# Altium footprint library Transformers.PcbLib: 81 footprints (part 4 of 6)
Each footprint in its own frame and in the unit in brackets; x right, y up, seen from the top. Pads: shape width x height; smd on the part's side, far side on the other; paste and mask are expansions set on the pad; w line width, h text height; cw(c..) or ccw(c..) is an arc to the next point about the centre after c.
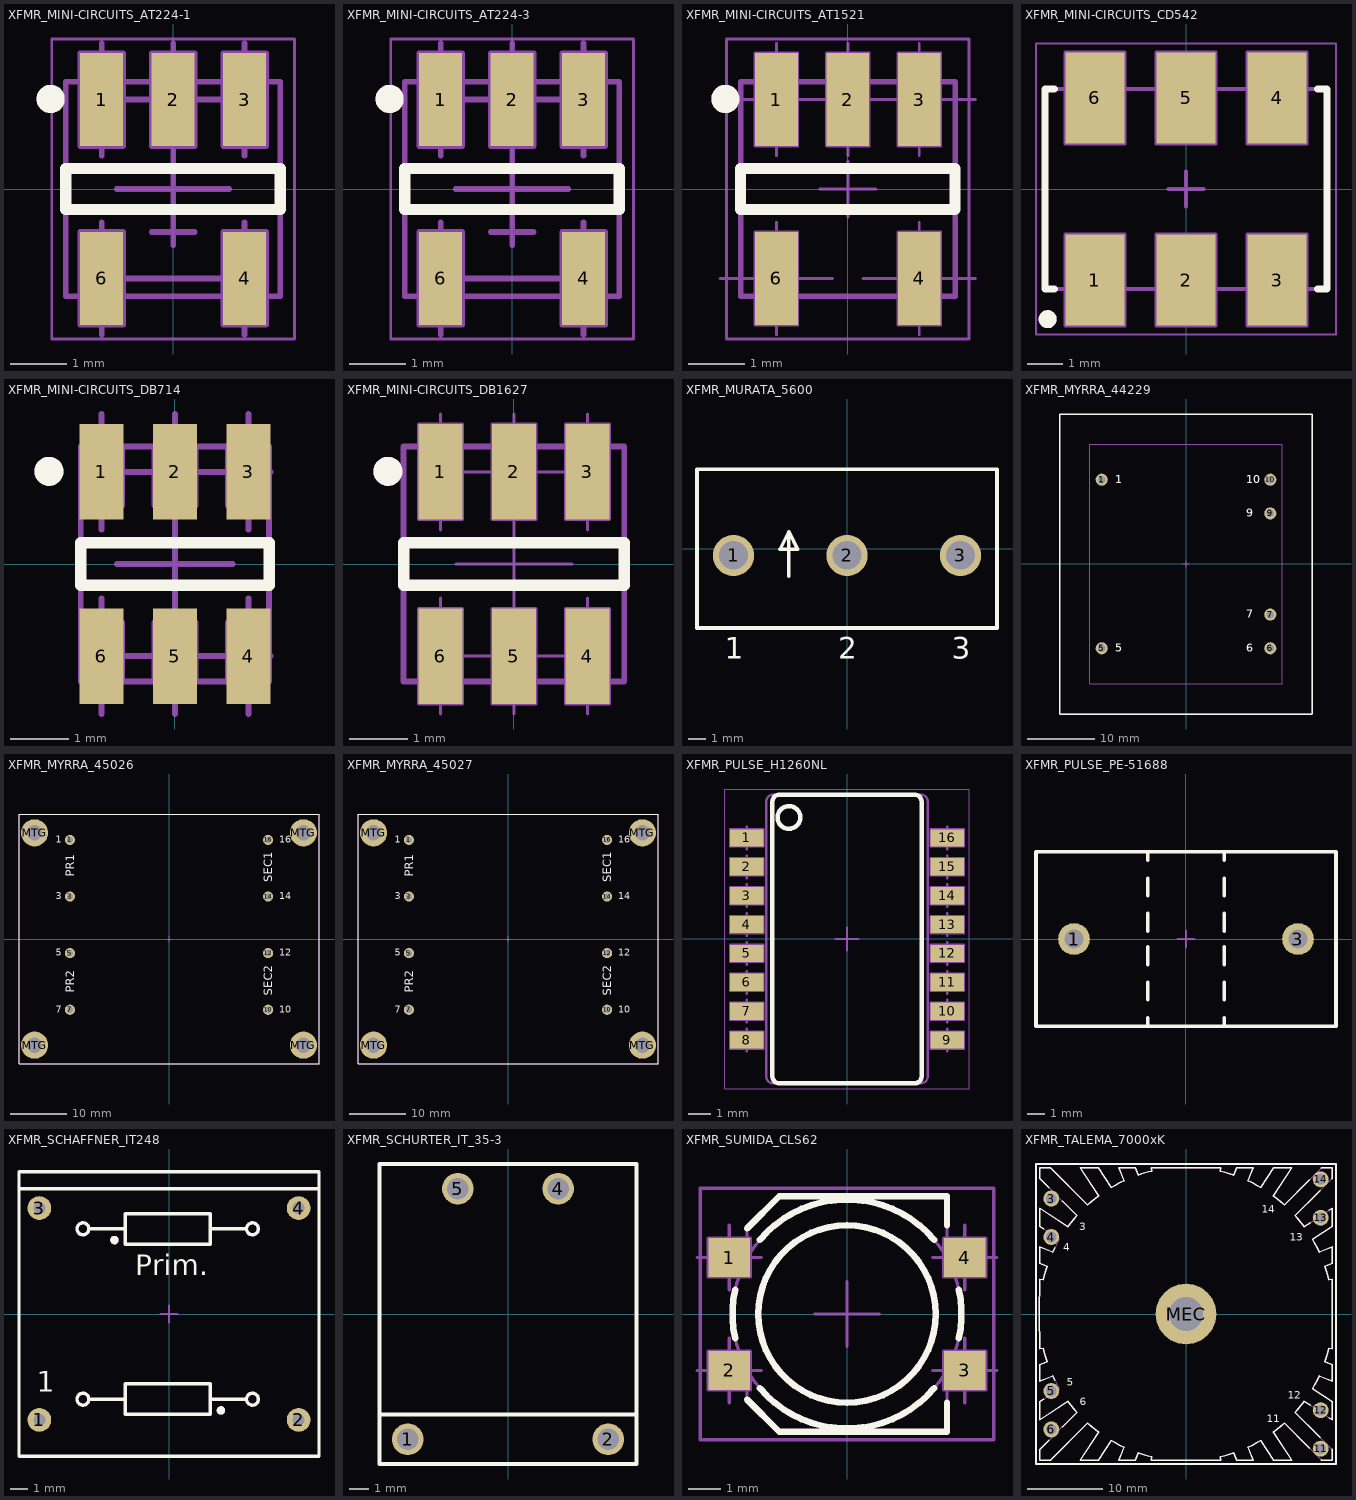
[diagram p3: the footprints below, top view; thin cyan lines are the x and y axes]

## XFMR_MINI-CIRCUITS_AT224-1 [mm] "MINI-CIRCUITS RF Transformer, Case AT224-1 - Body 3.81X3.81mm"
height 4.06
pads (5):
  rect 0.76x1.65 smd: 1(-1.27,1.59) 2(0,1.59) 3(1.27,1.59) 4(1.27,-1.59) 6(-1.27,-1.59)
Top Overlay:
  circle w0.25: c-2.175,1.6 r0.125
  lines w0.2: -1.905,-0.365 1.905,-0.365 1.905,0.365 -1.905,0.365 -1.905,-0.365
Mechanical 8:
  lines w0.1: -1.27,-2.59 -1.27,-1.59 ; -1.27,-0.59 -1.27,-1.59 ; -1.27,0.59 -1.27,1.59 ; -1.27,2.59 -1.27,1.59 ; -1,0 0,0 ; -0.38,-0.765 0.38,-0.765 ; 0,-1 0,0 ; 0,0.59 0,1.59 0,2.59 ; 0,1 0,0 ; 1,0 0,0 ; 1.27,-2.59 1.27,-1.59 1.27,-0.59 ; 1.27,0.59 1.27,1.59 1.27,2.59 ; 1.65,-1.59 -1.27,-1.59 ; 1.65,1.59 -1.27,1.59 ; -1.65,-2.415 -0.89,-2.415 -0.89,-0.765 -1.65,-0.765 -1.65,-2.415 ; -1.65,0.765 -0.89,0.765 -0.89,2.415 -1.65,2.415 -1.65,0.765 ; -0.38,0.765 0.38,0.765 0.38,2.415 -0.38,2.415 -0.38,0.765 ; 0.89,-2.415 1.65,-2.415 1.65,-0.765 0.89,-0.765 0.89,-2.415 ; 0.89,0.765 1.65,0.765 1.65,2.415 0.89,2.415 0.89,0.765
Mechanical 14:
  circle w0.25: c-2.175,1.6 r0.125
  lines w0.1: -1.625,-1.905 -1.625,-1.145 -0.915,-1.145 -0.915,-1.905 ; -1.625,1.905 -1.625,1.145 -0.915,1.145 -0.915,1.905 ; -0.355,1.905 -0.355,1.145 0.355,1.145 0.355,1.905 ; 0.915,-1.905 0.915,-1.145 1.625,-1.145 1.625,-1.905 ; 0.915,1.905 0.915,1.145 1.625,1.145 1.625,1.905 ; -1.905,-1.905 1.905,-1.905 1.905,1.905 -1.905,1.905 -1.905,-1.905
Mechanical 15:
  lines w0.05: -2.155,-2.665 2.155,-2.665 2.155,2.665 -2.155,2.665 -2.155,-2.665
3D body "XFMR_MINI-CIRCUITS_AT224-1.stp": height 4.06, standoff 0, extent -1.905,-1.905 1.905,1.905

## XFMR_MINI-CIRCUITS_AT224-3 [mm] "MINI-CIRCUITS RF Transformer, Case AT224-3 - Body 3.81X3.81mm"
height 3.81
pads (5):
  rect 0.76x1.65 smd: 1(-1.27,1.59) 2(0,1.59) 3(1.27,1.59) 4(1.27,-1.59) 6(-1.27,-1.59)
Top Overlay:
  circle w0.25: c-2.175,1.6 r0.125
  lines w0.2: -1.905,-0.365 -1.905,0.365 1.905,0.365 1.905,-0.365 -1.905,-0.365
Mechanical 8:
  lines w0.1: -1.27,-2.59 -1.27,-1.59 ; -1.27,-0.59 -1.27,-1.59 ; -1.27,0.59 -1.27,1.59 ; -1.27,2.59 -1.27,1.59 ; -1,0 0,0 ; -0.38,-0.765 0.38,-0.765 ; 0,-1 0,0 ; 0,0.59 0,1.59 0,2.59 ; 0,1 0,0 ; 1,0 0,0 ; 1.27,-2.59 1.27,-1.59 1.27,-0.59 ; 1.27,0.59 1.27,1.59 1.27,2.59 ; 1.65,-1.59 -1.27,-1.59 ; 1.65,1.59 -1.27,1.59 ; -1.65,-2.415 -1.65,-0.765 -0.89,-0.765 -0.89,-2.415 -1.65,-2.415 ; -1.65,0.765 -1.65,2.415 -0.89,2.415 -0.89,0.765 -1.65,0.765 ; -0.38,0.765 -0.38,2.415 0.38,2.415 0.38,0.765 -0.38,0.765 ; 0.89,-2.415 0.89,-0.765 1.65,-0.765 1.65,-2.415 0.89,-2.415 ; 0.89,0.765 0.89,2.415 1.65,2.415 1.65,0.765 0.89,0.765
Mechanical 14:
  circle w0.25: c-2.175,1.6 r0.125
  lines w0.1: -1.625,-1.905 -1.625,-1.145 -0.915,-1.145 -0.915,-1.905 ; -1.625,1.905 -1.625,1.145 -0.915,1.145 -0.915,1.905 ; -0.355,1.905 -0.355,1.145 0.355,1.145 0.355,1.905 ; 0.915,-1.905 0.915,-1.145 1.625,-1.145 1.625,-1.905 ; 0.915,1.905 0.915,1.145 1.625,1.145 1.625,1.905 ; -1.905,-1.905 -1.905,1.905 1.905,1.905 1.905,-1.905 -1.905,-1.905
Mechanical 15:
  lines w0.05: -2.155,-2.665 -2.155,2.665 2.155,2.665 2.155,-2.665 -2.155,-2.665
3D body "XFMR_MINI-CIRCUITS_AT224-3.stp": height 3.81, standoff 0, extent -1.905,-1.905 1.905,1.905

## XFMR_MINI-CIRCUITS_AT1521 [mm] "MINI-CIRCUITS RF Transformer, Case AT1521, Body 3.81X3.81mm"
height 4.06
pads (5):
  rect 0.76x1.65 smd: 1(-1.27,1.59) 2(0,1.59) 3(1.27,1.59) 4(1.27,-1.59) 6(-1.27,-1.59)
Top Overlay:
  circle w0.25: c-2.175,1.6 r0.125
  lines w0.2: -1.905,-0.365 -1.905,0.365 1.905,0.365 1.905,-0.365 -1.905,-0.365
Mechanical 8:
  lines w0.05: -2.27,-1.59 -0.27,-1.59 ; -2.27,1.59 -0.27,1.59 ; -1.27,-2.59 -1.27,-0.59 ; -1.27,0.59 -1.27,2.59 ; -1,1.59 1,1.59 ; -0.5,0 0,0 ; 0,-0.5 0,0 ; 0,0.5 0,0 ; 0,0.59 0,2.59 ; 0.27,-1.59 2.27,-1.59 ; 0.27,1.59 2.27,1.59 ; 0.5,0 0,0 ; 1.27,-2.59 1.27,-0.59 ; 1.27,0.59 1.27,2.59 ; -1.65,-2.415 -0.89,-2.415 -0.89,-0.765 -1.65,-0.765 -1.65,-2.415 ; -1.65,0.765 -0.89,0.765 -0.89,2.415 -1.65,2.415 -1.65,0.765 ; -0.38,0.765 0.38,0.765 0.38,2.415 -0.38,2.415 -0.38,0.765 ; 0.89,-2.415 1.65,-2.415 1.65,-0.765 0.89,-0.765 0.89,-2.415 ; 0.89,0.765 1.65,0.765 1.65,2.415 0.89,2.415 0.89,0.765
Mechanical 14:
  circle w0.25: c-2.175,1.6 r0.125
  lines w0.1: -1.625,-1.905 -1.625,-0.885 -0.915,-0.885 -0.915,-1.905 ; -1.625,1.905 -1.625,0.885 -0.915,0.885 -0.915,1.905 ; -0.355,1.905 -0.355,0.885 0.355,0.885 0.355,1.905 ; 0.915,-1.905 0.915,-0.885 1.625,-0.885 1.625,-1.905 ; 0.915,1.905 0.915,0.885 1.625,0.885 1.625,1.905 ; -1.905,-1.905 -1.905,1.905 1.905,1.905 1.905,-1.905 -1.905,-1.905
Mechanical 15:
  lines w0.05: -2.155,-2.665 -2.155,2.665 2.155,2.665 2.155,-2.665 -2.155,-2.665
3D body "XFMR_MINI-CIRCUITS_AT1521.stp": height 4.06, standoff 0, extent -1.905,-1.905 1.905,1.905

## XFMR_MINI-CIRCUITS_CD542 [mm] "MINI-CIRCUITS RF Transformer, Case CD542 - Body 7.87 X 5.58mm"
height 2.84
pads (6):
  rect 1.65x2.54 smd: 1(-2.54,-2.54) 2(0,-2.54) 3(2.54,-2.54) 4(2.54,2.54) 5(0,2.54) 6(-2.54,2.54)
Top Overlay:
  circle w0.25: c-3.861,-3.632 r0.125
  lines w0.2: -3.665,-2.79 -3.935,-2.79 -3.935,2.79 -3.665,2.79 ; 3.665,-2.79 3.935,-2.79 3.935,2.79 3.665,2.79
Mechanical 8:
  lines w0.1: -3.04,-2.54 -2.54,-2.54 ; -3.04,2.54 -2.54,2.54 ; -3.04,3.18 -2.54,3.18 ; -2.54,-3.04 -2.54,-2.54 ; -2.54,-2.04 -2.54,-2.54 ; -2.54,2.04 -2.54,2.54 ; -2.54,2.68 -2.54,3.18 ; -2.54,3.04 -2.54,2.54 ; -2.54,3.68 -2.54,3.18 ; -2.04,-2.54 -2.54,-2.54 ; -2.04,2.54 -2.54,2.54 ; -2.04,3.18 -2.54,3.18 ; -0.5,-2.54 0,-2.54 ; -0.5,0 0,0 ; -0.5,2.54 0,2.54 ; 0,-3.04 0,-2.54 ; 0,-2.04 0,-2.54 ; 0,-0.5 0,0 ; 0,0.5 0,0 ; 0,2.04 0,2.54 ; 0,3.04 0,2.54 ; 0.5,-2.54 0,-2.54 ; 0.5,0 0,0 ; 0.5,2.54 0,2.54 ; 2.04,-2.54 2.54,-2.54 ; 2.04,2.54 2.54,2.54 ; 2.54,-3.04 2.54,-2.54 ; 2.54,-2.04 2.54,-2.54 ; 2.54,2.04 2.54,2.54 ; 2.54,3.04 2.54,2.54 ; 3.04,-2.54 2.54,-2.54 ; 3.04,2.54 2.54,2.54 ; -3.365,-3.81 -3.365,-1.27 -1.715,-1.27 -1.715,-3.81 -3.365,-3.81 ; -3.365,1.27 -1.715,1.27 -1.715,3.81 -3.365,3.81 -3.365,1.27 ; -0.825,-3.81 0.825,-3.81 0.825,-1.27 -0.825,-1.27 -0.825,-3.81 ; -0.825,1.27 0.825,1.27 0.825,3.81 -0.825,3.81 -0.825,1.27 ; 1.715,-3.81 3.365,-3.81 3.365,-1.27 1.715,-1.27 1.715,-3.81 ; 1.715,1.27 3.365,1.27 3.365,3.81 1.715,3.81 1.715,1.27
Mechanical 14:
  circle w0.25: c-3.861,-3.632 r0.125
  lines w0.1: -2.92,-2.79 -2.92,-3.45 -2.16,-3.45 -2.16,-2.79 ; -2.92,2.79 -2.92,3.45 -2.16,3.45 -2.16,2.79 ; -0.38,-2.79 -0.38,-3.45 0.38,-3.45 0.38,-2.79 ; -0.38,2.79 -0.38,3.45 0.38,3.45 0.38,2.79 ; 2.16,-2.79 2.16,-3.45 2.92,-3.45 2.92,-2.79 ; 2.16,2.79 2.16,3.45 2.92,3.45 2.92,2.79 ; -3.935,-2.79 -3.935,2.79 3.935,2.79 3.935,-2.79 -3.935,-2.79
Mechanical 15:
  lines w0.05: -4.185,-4.06 -4.185,4.06 4.185,4.06 4.185,-4.06 -4.185,-4.06
3D body "XFMR_MINI-CIRCUITS_CD542.stp": height 2.84, standoff 0, extent -3.935,-3.45 3.935,3.45

## XFMR_MINI-CIRCUITS_DB714 [mm] "MINI-CIRCUITS RF Transformer, Case DB715 - Body 4.06X3.81mm"
height 4.06
pads (6):
  rect 0.76x1.65 smd: 1(-1.27,1.59) 2(0,1.59) 3(1.27,1.59) 4(1.27,-1.59) 5(0,-1.59) 6(-1.27,-1.59)
Top Overlay:
  circle w0.25: c-2.175,1.6 r0.125
  lines w0.2: -1.625,-0.365 1.625,-0.365 1.625,0.365 -1.625,0.365 -1.625,-0.365
Mechanical 8:
  lines w0.1: -1.27,-2.59 -1.27,-1.59 ; -1.27,-0.59 -1.27,-1.59 ; -1.27,0.59 -1.27,1.59 ; -1.27,2.59 -1.27,1.59 ; -1,0 0,0 ; 0,-2.59 0,-1.59 0,-0.59 ; 0,-1 0,0 ; 0,0.59 0,1.59 0,2.59 ; 0,1 0,0 ; 1,0 0,0 ; 1.27,-2.59 1.27,-1.59 1.27,-0.59 ; 1.27,0.59 1.27,1.59 1.27,2.59 ; 1.65,-1.59 -1.27,-1.59 ; 1.65,1.59 -1.27,1.59
Mechanical 14:
  circle w0.25: c-2.175,1.6 r0.125
  lines w0.1: -1.625,-2.03 1.625,-2.03 ; -1.625,-2.03 -1.625,2.03 ; -1.625,-2.03 -1.625,-1.01 -0.915,-1.01 -0.915,-2.03 -1.625,-2.03 ; -1.625,2.03 1.625,2.03 ; -1.625,2.03 -1.625,1.01 -0.915,1.01 -0.915,2.03 -1.625,2.03 ; 1.625,-2.03 1.625,2.03 ; 1.625,-2.03 0.915,-2.03 0.915,-1.01 1.625,-1.01 1.625,-2.03 ; 1.625,2.03 1.625,1.01 0.915,1.01 0.915,2.03 1.625,2.03 ; -0.355,-2.03 -0.355,-1.01 0.355,-1.01 0.355,-2.03 -0.355,-2.03 ; -0.355,1.01 -0.355,2.03 0.355,2.03 0.355,1.01 -0.355,1.01
3D body "XFMR_MINI-CIRCUITS_DB714.stp": height 3.76, standoff 0, extent -1.625,-2.03 1.625,2.03

## XFMR_MINI-CIRCUITS_DB1627 [mm] "MINI-CIRCUITS RF Transformer, Case DB1627 - Body 4.06X3.81mm"
height 4.06
pads (6):
  rect 0.76x1.65 smd: 1(-1.27,1.59) 2(0,1.59) 3(1.27,1.59) 4(1.27,-1.59) 5(0,-1.59) 6(-1.27,-1.59)
Top Overlay:
  circle w0.25: c-2.175,1.6 r0.125
  lines w0.2: -1.905,-0.365 -1.905,0.365 1.905,0.365 1.905,-0.365 -1.905,-0.365
Mechanical 8:
  lines w0.05: -1.27,-2.59 -1.27,-1.59 ; -1.27,-0.59 -1.27,-1.59 ; -1.27,0.59 -1.27,1.59 ; -1.27,2.59 -1.27,1.59 ; -1,0 0,0 ; 0,-2.59 0,-1.59 0,-0.59 ; 0,-1 0,0 ; 0,0.59 0,1.59 0,2.59 ; 0,1 0,0 ; 1,0 0,0 ; 1.27,-2.59 1.27,-1.59 1.27,-0.59 ; 1.27,0.59 1.27,1.59 1.27,2.59 ; 1.65,-1.59 -1.27,-1.59 ; 1.65,1.59 -1.27,1.59 ; -1.65,-2.415 -1.65,-0.765 -0.89,-0.765 -0.89,-2.415 -1.65,-2.415 ; -1.65,0.765 -1.65,2.415 -0.89,2.415 -0.89,0.765 -1.65,0.765 ; -0.38,-2.415 -0.38,-0.765 0.38,-0.765 0.38,-2.415 -0.38,-2.415 ; -0.38,0.765 -0.38,2.415 0.38,2.415 0.38,0.765 -0.38,0.765 ; 0.89,-2.415 0.89,-0.765 1.65,-0.765 1.65,-2.415 0.89,-2.415 ; 0.89,0.765 0.89,2.415 1.65,2.415 1.65,0.765 0.89,0.765
Mechanical 14:
  circle w0.25: c-2.175,1.6 r0.125
  lines w0.1: -1.905,-2.03 -1.905,2.03 1.905,2.03 1.905,-2.03 -1.905,-2.03 ; -1.625,-2.03 -0.915,-2.03 -0.915,-1.01 -1.625,-1.01 -1.625,-2.03 ; -1.625,1.01 -0.915,1.01 -0.915,2.03 -1.625,2.03 -1.625,1.01 ; -0.355,-2.03 0.355,-2.03 0.355,-1.01 -0.355,-1.01 -0.355,-2.03 ; -0.355,1.01 0.355,1.01 0.355,2.03 -0.355,2.03 -0.355,1.01 ; 0.915,-2.03 1.625,-2.03 1.625,-1.01 0.915,-1.01 0.915,-2.03 ; 0.915,1.01 1.625,1.01 1.625,2.03 0.915,2.03 0.915,1.01
3D body "XFMR_MINI-CIRCUITS_DB1627.stp": height 4.06, standoff 0, extent -1.905,-2.03 1.905,2.03

## XFMR_MURATA_5600 [mm] "MURATA Current Sensing Transformer, Body 16.79x8.89mm, 5600 Serie"
height 20.44
pads (3):
  round 2.3 hole 1.6: 1(-6.35,-0.386) 2(0,-0.386) 3(6.35,-0.386)
Top Overlay:
  lines w0.2: -3.25,-1.55 -3.25,0.95 ; -3.25,0.95 -2.75,-0.05 -3.75,-0.05 -3.25,0.95 ; -8.395,-4.445 8.395,-4.445 8.395,4.445 -8.395,4.445 -8.395,-4.445
  text "3" at 5.86,-6.175 h1.2
  text "2" at -0.49,-6.175 h1.2
  text "1" at -6.84,-6.175 h1.2
Mechanical 8:
  lines w0.1: -6.85,-0.386 -6.35,-0.386 ; -6.35,-0.886 -6.35,-0.386 ; -6.35,0.114 -6.35,-0.386 ; -5.85,-0.386 -6.35,-0.386 ; -0.5,-0.386 0,-0.386 ; -0.5,0 0,0 ; 0,-0.886 0,-0.386 ; 0,0.5 0,0 ; 0.5,-0.386 0,-0.386 ; 0.5,0 0,0 ; 5.85,-0.386 6.35,-0.386 ; 6.35,-0.886 6.35,-0.386 ; 6.35,0.114 6.35,-0.386 ; 6.85,-0.386 6.35,-0.386
Mechanical 14:
  lines w0.1: -3.25,-1.55 -3.25,0.95 ; -3.25,0.95 -3.75,-0.05 -2.75,-0.05 -3.25,0.95 ; -8.395,-4.445 8.395,-4.445 8.395,4.445 -8.395,4.445 -8.395,-4.445
  text "3" at 5.86,-6.175 h1.2
  text "2" at -0.49,-6.175 h1.2
  text "1" at -6.84,-6.175 h1.2
3D body "XFMR_MURATA_56000.stp": height 20.19, standoff -3.6, extent -8.395,-4.445 8.395,4.445

## XFMR_MYRRA_44229 [mm] "250V to 6V EI 42x14.8, 5VA Encapsulated Transformer Serie  44000"
height 32.8
pads (6):
  round 1.8 hole 1.1: 1(-12.5,12.5) 5(-12.5,-12.5) 6(12.5,-12.5) 7(12.5,-7.5) 9(12.5,7.5) 10(12.5,12.5)
Top Overlay:
  lines w0.2: -18.75,-22.25 -18.75,22.25 18.75,22.25 18.75,-22.25 -18.75,-22.25
  text "1" at -10.475,12 h1.2
  text "5" at -10.475,-13 h1.2
  text "10" at 8.95,12 h1.2
  text "9" at 8.95,7 h1.2
  text "7" at 8.95,-8 h1.2
  text "6" at 8.95,-13 h1.2
  text "6" at 8.95,-13 h1.2
  text "7" at 8.95,-8 h1.2
  text "9" at 8.95,7 h1.2
  text "10" at 8.95,12 h1.2
  text "5" at -10.475,-13 h1.2
  text "1" at -10.475,12 h1.2
Mechanical 8:
  lines w0.1: -13,-12.5 -12.5,-12.5 ; -13,12.5 -12.5,12.5 ; -12.5,-13 -12.5,-12.5 ; -12.5,-12 -12.5,-12.5 ; -12.5,12 -12.5,12.5 ; -12.5,13 -12.5,12.5 ; -12,-12.5 -12.5,-12.5 ; -12,12.5 -12.5,12.5 ; -0.5,0 0,0 ; 0,-0.5 0,0 ; 0,0.5 0,0 ; 0.5,0 0,0 ; 12,-12.5 12.5,-12.5 ; 12,-7.5 12.5,-7.5 ; 12,7.5 12.5,7.5 ; 12,12.5 12.5,12.5 ; 12.5,-13 12.5,-12.5 ; 12.5,-12 12.5,-12.5 ; 12.5,-8 12.5,-7.5 ; 12.5,-7 12.5,-7.5 ; 12.5,7 12.5,7.5 ; 12.5,8 12.5,7.5 ; 12.5,12 12.5,12.5 ; 12.5,13 12.5,12.5 ; 13,-12.5 12.5,-12.5 ; 13,-7.5 12.5,-7.5 ; 13,7.5 12.5,7.5 ; 13,12.5 12.5,12.5
Mechanical 14:
  lines w0.1: -18.75,-22.25 -18.75,22.25 18.75,22.25 18.75,-22.25 -18.75,-22.25 ; -14.25,-17.75 14.25,-17.75 14.25,17.75 -14.25,17.75 -14.25,-17.75
3D body "XFMR_MYRRA_44229.stp": height 32.8, standoff -3.6, extent -18.75,-22.25 18.75,22.25

## XFMR_MYRRA_45026 [mm] "250V to 2x9V, UI 30, 6VA Encapsulated Transformer Serie  45000"
height 22
pads (12):
  round 1.8 hole 1.1: 1(-17.5,17.5) 3(-17.5,7.5) 5(-17.5,-2.5) 7(-17.5,-12.5) 10(17.5,-12.5) 12(17.5,-2.5) 14(17.5,7.5) 16(17.5,17.5)
  round 4.8 hole 2.7: MTG(-23.75,-18.75) MTG(-23.75,18.75) MTG(23.75,-18.75) MTG(23.75,18.75)
Top Overlay:
  lines w0.2: -26.5,-22 26.5,-22 26.5,22 -26.5,22 -26.5,-22
  text "SEC1" at 18.25,10 h1.5
  text "SEC2" at 18.25,-10 h1.5
  text "PR2" at -16.75,-9.5 h1.5
  text "PR1" at -16.75,11 h1.5
  text "1" at -20,17 h1.2
  text "3" at -20,7 h1.2
  text "5" at -20,-3 h1.2
  text "7" at -20,-13 h1.2
  text "16" at 19.5,17 h1.2
  text "14" at 19.5,7 h1.2
  text "12" at 19.5,-3 h1.2
  text "10" at 19.5,-13 h1.2
Mechanical 8:
  lines w0.1: -24.25,-18.75 -23.75,-18.75 ; -24.25,18.75 -23.75,18.75 ; -23.75,-19.25 -23.75,-18.75 ; -23.75,-18.25 -23.75,-18.75 ; -23.75,18.25 -23.75,18.75 ; -23.75,19.25 -23.75,18.75 ; -23.25,-18.75 -23.75,-18.75 ; -23.25,18.75 -23.75,18.75 ; -18,-12.5 -17.5,-12.5 ; -18,-2.5 -17.5,-2.5 ; -18,7.5 -17.5,7.5 ; -18,17.5 -17.5,17.5 ; -17.5,-13 -17.5,-12.5 ; -17.5,-12 -17.5,-12.5 ; -17.5,-3 -17.5,-2.5 ; -17.5,-2 -17.5,-2.5 ; -17.5,7 -17.5,7.5 ; -17.5,8 -17.5,7.5 ; -17.5,17 -17.5,17.5 ; -17.5,18 -17.5,17.5 ; -17,-12.5 -17.5,-12.5 ; -17,-2.5 -17.5,-2.5 ; -17,7.5 -17.5,7.5 ; -17,17.5 -17.5,17.5 ; -0.5,0 0,0 ; 0,-0.5 0,0 ; 0,0.5 0,0 ; 0.5,0 0,0 ; 17,-12.5 17.5,-12.5 ; 17,-2.5 17.5,-2.5 ; 17,7.5 17.5,7.5 ; 17,17.5 17.5,17.5 ; 17.5,-13 17.5,-12.5 ; 17.5,-12 17.5,-12.5 ; 17.5,-3 17.5,-2.5 ; 17.5,-2 17.5,-2.5 ; 17.5,7 17.5,7.5 ; 17.5,8 17.5,7.5 ; 17.5,17 17.5,17.5 ; 17.5,18 17.5,17.5 ; 18,-12.5 17.5,-12.5 ; 18,-2.5 17.5,-2.5 ; 18,7.5 17.5,7.5 ; 18,17.5 17.5,17.5 ; 23.25,-18.75 23.75,-18.75 ; 23.25,18.75 23.75,18.75 ; 23.75,-19.25 23.75,-18.75 ; 23.75,-18.25 23.75,-18.75 ; 23.75,18.25 23.75,18.75 ; 23.75,19.25 23.75,18.75 ; 24.25,-18.75 23.75,-18.75 ; 24.25,18.75 23.75,18.75
Mechanical 14:
  lines w0.1: -26.5,-22 26.5,-22 26.5,22 -26.5,22 -26.5,-22
3D body "XFMR_MYRRA_45026.stp": height 22, standoff -4, extent -26.5,-22 26.5,22

## XFMR_MYRRA_45027 [mm] "250V to 2x12V, UI 30, 6VA Encapsulated Transformer Serie  45000"
height 22
pads (12):
  round 1.8 hole 1.1: 1(-17.5,17.5) 3(-17.5,7.5) 5(-17.5,-2.5) 7(-17.5,-12.5) 10(17.5,-12.5) 12(17.5,-2.5) 14(17.5,7.5) 16(17.5,17.5)
  round 4.8 hole 2.7: MTG(-23.75,-18.75) MTG(-23.75,18.75) MTG(23.75,-18.75) MTG(23.75,18.75)
Top Overlay:
  lines w0.2: -26.5,-22 26.5,-22 26.5,22 -26.5,22 -26.5,-22
  text "SEC1" at 18.25,10 h1.5
  text "SEC2" at 18.25,-10 h1.5
  text "PR2" at -16.75,-9.5 h1.5
  text "PR1" at -16.75,11 h1.5
  text "1" at -20,17 h1.2
  text "3" at -20,7 h1.2
  text "5" at -20,-3 h1.2
  text "7" at -20,-13 h1.2
  text "16" at 19.5,17 h1.2
  text "14" at 19.5,7 h1.2
  text "12" at 19.5,-3 h1.2
  text "10" at 19.5,-13 h1.2
Mechanical 8:
  lines w0.1: -24.25,-18.75 -23.75,-18.75 ; -24.25,18.75 -23.75,18.75 ; -23.75,-19.25 -23.75,-18.75 ; -23.75,-18.25 -23.75,-18.75 ; -23.75,18.25 -23.75,18.75 ; -23.75,19.25 -23.75,18.75 ; -23.25,-18.75 -23.75,-18.75 ; -23.25,18.75 -23.75,18.75 ; -18,-12.5 -17.5,-12.5 ; -18,-2.5 -17.5,-2.5 ; -18,7.5 -17.5,7.5 ; -18,17.5 -17.5,17.5 ; -17.5,-13 -17.5,-12.5 ; -17.5,-12 -17.5,-12.5 ; -17.5,-3 -17.5,-2.5 ; -17.5,-2 -17.5,-2.5 ; -17.5,7 -17.5,7.5 ; -17.5,8 -17.5,7.5 ; -17.5,17 -17.5,17.5 ; -17.5,18 -17.5,17.5 ; -17,-12.5 -17.5,-12.5 ; -17,-2.5 -17.5,-2.5 ; -17,7.5 -17.5,7.5 ; -17,17.5 -17.5,17.5 ; -0.5,0 0,0 ; 0,-0.5 0,0 ; 0,0.5 0,0 ; 0.5,0 0,0 ; 17,-12.5 17.5,-12.5 ; 17,-2.5 17.5,-2.5 ; 17,7.5 17.5,7.5 ; 17,17.5 17.5,17.5 ; 17.5,-13 17.5,-12.5 ; 17.5,-12 17.5,-12.5 ; 17.5,-3 17.5,-2.5 ; 17.5,-2 17.5,-2.5 ; 17.5,7 17.5,7.5 ; 17.5,8 17.5,7.5 ; 17.5,17 17.5,17.5 ; 17.5,18 17.5,17.5 ; 18,-12.5 17.5,-12.5 ; 18,-2.5 17.5,-2.5 ; 18,7.5 17.5,7.5 ; 18,17.5 17.5,17.5 ; 23.25,-18.75 23.75,-18.75 ; 23.25,18.75 23.75,18.75 ; 23.75,-19.25 23.75,-18.75 ; 23.75,-18.25 23.75,-18.75 ; 23.75,18.25 23.75,18.75 ; 23.75,19.25 23.75,18.75 ; 24.25,-18.75 23.75,-18.75 ; 24.25,18.75 23.75,18.75
Mechanical 14:
  lines w0.1: -26.5,-22 26.5,-22 26.5,22 -26.5,22 -26.5,-22
3D body "XFMR_MYRRA_45027.stp": height 22, standoff -4, extent -26.5,-22 26.5,22

## XFMR_PULSE_H1260NL [mm] "10/100BASE-T Transformer Modules, Body 7.11 x 12.7mm"
height 6
pads (16):
  rect 1.46x0.76 smd: 1(-4.41,4.445) 2(-4.41,3.175) 3(-4.41,1.905) 4(-4.41,0.635) 5(-4.41,-0.635) 6(-4.41,-1.905) 7(-4.41,-3.175) 8(-4.41,-4.445) 9(4.41,-4.445) 10(4.41,-3.175) 11(4.41,-1.905) 12(4.41,-0.635) 13(4.41,0.635) 14(4.41,1.905) 15(4.41,3.175) 16(4.41,4.445)
Top Overlay:
  circle w0.2: c-2.555,5.35 r0.5
  lines w0.2: -3.28,-6.05 ccw(c-2.98,-6.05) -2.98,-6.35 2.98,-6.35 ccw(c2.98,-6.05) 3.28,-6.05 3.28,6.05 ccw(c2.98,6.05) 2.98,6.35 -2.98,6.35 ccw(c-2.98,6.05) -3.28,6.05 -3.28,-6.05
Mechanical 8:
  lines w0.1: -4.91,-4.445 -4.41,-4.445 ; -4.91,-3.175 -4.41,-3.175 ; -4.91,-1.905 -4.41,-1.905 ; -4.91,-0.635 -4.41,-0.635 ; -4.91,0.635 -4.41,0.635 ; -4.91,1.905 -4.41,1.905 ; -4.91,3.175 -4.41,3.175 ; -4.91,4.445 -4.41,4.445 ; -4.41,-4.945 -4.41,-4.445 ; -4.41,-3.945 -4.41,-4.445 ; -4.41,-3.675 -4.41,-3.175 ; -4.41,-2.675 -4.41,-3.175 ; -4.41,-2.405 -4.41,-1.905 ; -4.41,-1.405 -4.41,-1.905 ; -4.41,-1.135 -4.41,-0.635 ; -4.41,-0.135 -4.41,-0.635 ; -4.41,0.135 -4.41,0.635 ; -4.41,1.135 -4.41,0.635 ; -4.41,1.405 -4.41,1.905 ; -4.41,2.405 -4.41,1.905 ; -4.41,2.675 -4.41,3.175 ; -4.41,3.675 -4.41,3.175 ; -4.41,3.945 -4.41,4.445 ; -4.41,4.945 -4.41,4.445 ; -3.91,-4.445 -4.41,-4.445 ; -3.91,-3.175 -4.41,-3.175 ; -3.91,-1.905 -4.41,-1.905 ; -3.91,-0.635 -4.41,-0.635 ; -3.91,0.635 -4.41,0.635 ; -3.91,1.905 -4.41,1.905 ; -3.91,3.175 -4.41,3.175 ; -3.91,4.445 -4.41,4.445 ; -0.5,0 0,0 ; 0,-0.5 0,0 ; 0,0.5 0,0 ; 0.5,0 0,0 ; 3.91,-4.445 4.41,-4.445 ; 3.91,-3.175 4.41,-3.175 ; 3.91,-1.905 4.41,-1.905 ; 3.91,-0.635 4.41,-0.635 ; 3.91,0.635 4.41,0.635 ; 3.91,1.905 4.41,1.905 ; 3.91,3.175 4.41,3.175 ; 3.91,4.445 4.41,4.445 ; 4.41,-4.945 4.41,-4.445 ; 4.41,-3.945 4.41,-4.445 ; 4.41,-3.675 4.41,-3.175 ; 4.41,-2.675 4.41,-3.175 ; 4.41,-2.405 4.41,-1.905 ; 4.41,-1.405 4.41,-1.905 ; 4.41,-1.135 4.41,-0.635 ; 4.41,-0.135 4.41,-0.635 ; 4.41,0.135 4.41,0.635 ; 4.41,1.135 4.41,0.635 ; 4.41,1.405 4.41,1.905 ; 4.41,2.405 4.41,1.905 ; 4.41,2.675 4.41,3.175 ; 4.41,3.675 4.41,3.175 ; 4.41,3.945 4.41,4.445 ; 4.41,4.945 4.41,4.445 ; 4.91,-4.445 4.41,-4.445 ; 4.91,-3.175 4.41,-3.175 ; 4.91,-1.905 4.41,-1.905 ; 4.91,-0.635 4.41,-0.635 ; 4.91,0.635 4.41,0.635 ; 4.91,1.905 4.41,1.905 ; 4.91,3.175 4.41,3.175 ; 4.91,4.445 4.41,4.445 ; -5.14,-4.825 -5.14,-4.065 -3.68,-4.065 -3.68,-4.825 -5.14,-4.825 ; -5.14,-3.555 -5.14,-2.795 -3.68,-2.795 -3.68,-3.555 -5.14,-3.555 ; -5.14,-2.285 -5.14,-1.525 -3.68,-1.525 -3.68,-2.285 -5.14,-2.285 ; -5.14,-1.015 -5.14,-0.255 -3.68,-0.255 -3.68,-1.015 -5.14,-1.015 ; -5.14,0.255 -5.14,1.015 -3.68,1.015 -3.68,0.255 -5.14,0.255 ; -5.14,1.525 -5.14,2.285 -3.68,2.285 -3.68,1.525 -5.14,1.525 ; -5.14,2.795 -5.14,3.555 -3.68,3.555 -3.68,2.795 -5.14,2.795 ; -5.14,4.065 -5.14,4.825 -3.68,4.825 -3.68,4.065 -5.14,4.065 ; 3.68,-4.825 3.68,-4.065 5.14,-4.065 5.14,-4.825 3.68,-4.825 ; 3.68,-3.555 3.68,-2.795 5.14,-2.795 5.14,-3.555 3.68,-3.555 ; 3.68,-2.285 3.68,-1.525 5.14,-1.525 5.14,-2.285 3.68,-2.285 ; 3.68,-1.015 3.68,-0.255 5.14,-0.255 5.14,-1.015 3.68,-1.015 ; 3.68,0.255 3.68,1.015 5.14,1.015 5.14,0.255 3.68,0.255 ; 3.68,1.525 3.68,2.285 5.14,2.285 5.14,1.525 3.68,1.525 ; 3.68,2.795 3.68,3.555 5.14,3.555 5.14,2.795 3.68,2.795 ; 3.68,4.065 3.68,4.825 5.14,4.825 5.14,4.065 3.68,4.065
Mechanical 14:
  circle w0.1: c-2.555,5.35 r0.5
  lines w0.1: -3.555,-6.05 ccw(c-3.255,-6.05) -3.255,-6.35 3.255,-6.35 ccw(c3.255,-6.05) 3.555,-6.05 3.555,6.05 ccw(c3.255,6.05) 3.255,6.35 -3.255,6.35 ccw(c-3.255,6.05) -3.555,6.05 -3.555,-6.05
Mechanical 15:
  lines w0.05: -5.39,-6.6 5.39,-6.6 5.39,6.6 -5.39,6.6 -5.39,-6.6
3D body "XFMR_PULSE_H1260NL.stp": height 6, standoff 0, extent -4.775,-6.35 4.775,6.35

## XFMR_PULSE_PE-51688 [mm] "20kHz To 200kHz 20A Current Sense Transformer, Body 17.01mm x 9.906mm"
height 20.32
pads (2):
  round 1.8 hole 1.1: 1(-6.35,0) 3(6.35,0)
Top Overlay:
  lines w0.2: -2.16,-4.953 -2.16,-4.453 ; -2.16,-3.453 -2.16,-2.453 ; -2.16,-1.453 -2.16,-0.453 ; -2.16,0.453 -2.16,1.453 ; -2.16,2.453 -2.16,3.453 ; -2.16,4.453 -2.16,4.953 ; 2.16,-4.953 2.16,-4.453 ; 2.16,-3.453 2.16,-2.453 ; 2.16,-1.453 2.16,-0.453 ; 2.16,0.453 2.16,1.453 ; 2.16,2.453 2.16,3.453 ; 2.16,4.453 2.16,4.953 ; -8.505,-4.953 8.505,-4.953 8.505,4.953 -8.505,4.953 -8.505,-4.953
Mechanical 8:
  lines w0.1: -6.85,0 -6.35,0 ; -6.35,-0.5 -6.35,0 ; -6.35,0.5 -6.35,0 ; -5.85,0 -6.35,0 ; -0.5,0 0,0 ; 0,-0.5 0,0 ; 0,0.5 0,0 ; 0.5,0 0,0 ; 5.85,0 6.35,0 ; 6.35,-0.5 6.35,0 ; 6.35,0.5 6.35,0 ; 6.85,0 6.35,0
Mechanical 14:
  lines w0.1: -2.16,-4.953 -2.16,-4.453 ; -2.16,-3.453 -2.16,-2.453 ; -2.16,-1.453 -2.16,-0.453 ; -2.16,0.453 -2.16,1.453 ; -2.16,2.453 -2.16,3.453 ; -2.16,4.453 -2.16,4.953 ; 2.16,-4.953 2.16,-4.453 ; 2.16,-3.453 2.16,-2.453 ; 2.16,-1.453 2.16,-0.453 ; 2.16,0.453 2.16,1.453 ; 2.16,2.453 2.16,3.453 ; 2.16,4.453 2.16,4.953 ; -8.505,-4.953 8.505,-4.953 8.505,4.953 -8.505,4.953 -8.505,-4.953
3D body "XFMR_PULSE_PE-51688.stp": height 20.28, standoff -3.22, extent -8.505,-4.953 8.505,4.953

## XFMR_SCHAFFNER_IT248 [mm] "Pulse Transformer, Serie IT, Body 17.6mm x 16.7mm"
height 11.4
pads (4):
  round 1.4 hole 0.7: 1(-7.65,-6.25) 2(7.65,-6.25) 3(-7.65,6.25) 4(7.65,6.25)
Top Overlay:
  circle w0.25: c3.064,-5.689 r0.125
  circle w0.2: c-5.077,-5.025 r0.35
  circle w0.2: c4.923,-5.025 r0.35
  circle w0.25: c-3.218,4.362 r0.125
  circle w0.2: c-5.077,5.025 r0.35
  circle w0.2: c4.923,5.025 r0.35
  lines w0.2: -8.85,7.4 8.85,7.4 ; -4.727,-5.025 -2.577,-5.025 ; -4.727,5.025 -2.577,5.025 ; 2.423,-5.025 4.573,-5.025 ; 2.423,5.025 4.573,5.025 ; -8.85,-8.4 8.85,-8.4 8.85,8.4 -8.85,8.4 -8.85,-8.4 ; -2.577,-5.925 2.423,-5.925 2.423,-4.125 -2.577,-4.125 -2.577,-5.925 ; -2.577,4.125 2.423,4.125 2.423,5.925 -2.577,5.925 -2.577,4.125
  text "1" at -7.8,-4.6 h1.2
  text "Prim." at -2,2.3 h1.2
Mechanical 8:
  lines w0.1: -8.15,-6.25 -7.65,-6.25 ; -8.15,6.25 -7.65,6.25 ; -7.65,-6.75 -7.65,-6.25 ; -7.65,-5.75 -7.65,-6.25 ; -7.65,5.75 -7.65,6.25 ; -7.65,6.75 -7.65,6.25 ; -7.15,-6.25 -7.65,-6.25 ; -7.15,6.25 -7.65,6.25 ; -0.5,0 0,0 ; 0,-0.5 0,0 ; 0,0.5 0,0 ; 0.5,0 0,0 ; 7.15,-6.25 7.65,-6.25 ; 7.15,6.25 7.65,6.25 ; 7.65,-6.75 7.65,-6.25 ; 7.65,-5.75 7.65,-6.25 ; 7.65,5.75 7.65,6.25 ; 7.65,6.75 7.65,6.25 ; 8.15,-6.25 7.65,-6.25 ; 8.15,6.25 7.65,6.25
Mechanical 14:
  circle w0.25: c3.064,-5.689 r0.125
  circle w0.1: c-5.077,-5.025 r0.35
  circle w0.1: c4.923,-5.025 r0.35
  circle w0.25: c-3.218,4.362 r0.125
  circle w0.1: c-5.077,5.025 r0.35
  circle w0.1: c4.923,5.025 r0.35
  lines w0.1: -8.85,7.4 8.85,7.4 ; -4.727,-5.025 -2.577,-5.025 ; -4.727,5.025 -2.577,5.025 ; 2.423,-5.025 4.573,-5.025 ; 2.423,5.025 4.573,5.025 ; -8.85,-8.4 8.85,-8.4 8.85,8.4 -8.85,8.4 -8.85,-8.4 ; -2.577,-5.925 2.423,-5.925 2.423,-4.125 -2.577,-4.125 -2.577,-5.925 ; -2.577,4.125 2.423,4.125 2.423,5.925 -2.577,5.925 -2.577,4.125
  text "1" at -7.8,-4.6 h1.2
  text "Prim." at -2,2.3 h1.2
3D body "XFMR_SCHAFFNER_IT248.stp": height 11.4, standoff -3.2, extent -8.85,-8.4 8.85,8.4

## XFMR_SCHURTER_IT_35-3 [mm] "Pulse Transformer, Serie IT, Case 35-3,  Body 15.2mm x 13mm"
height 10.6
pads (4):
  round 1.6 hole 1.1: 1(-5.08,-6.35) 2(5.08,-6.35) 4(2.54,6.35) 5(-2.54,6.35)
Top Overlay:
  lines w0.2: -6.5,-5.1 6.5,-5.1 ; -6.5,-7.6 -6.5,7.6 6.5,7.6 6.5,-7.6 -6.5,-7.6
Mechanical 14:
  lines w0.1: -6.5,-5.1 6.5,-5.1 ; -6.5,-7.6 -6.5,7.6 6.5,7.6 6.5,-7.6 -6.5,-7.6
3D body "XFMR_SCHURTER_IT_35-3.stp": height 10.6, standoff -3.6, extent -6.5,-7.6 6.5,7.6

## XFMR_SUMIDA_CLS62 [mm] "SMD Power Inductor CLS62 Serie"
height 2.5
pads (4):
  rect 1.3x1.2 smd: 1(-3.65,1.75) 2(-3.65,-1.75) 3(3.65,-1.75) 4(3.65,1.75)
Top Overlay:
  circle w0.2: c0,0 r2.75
  lines w0.2: -3.47,-0.75 cw(c0,0) -3.47,0.75 ; -3.1,-2.65 -2.1,-3.65 3.1,-3.65 3.1,-2.75 ; -3.1,2.65 -2.1,3.65 3.1,3.65 3.1,2.75 ; -2.7,-2.305 ccw(c0,0) 2.7,-2.305 ; -2.7,2.305 cw(c0,0) 2.7,2.305 ; 3.47,-0.75 ccw(c0,0) 3.47,0.75
Mechanical 8:
  lines w0.1: -4.65,-1.75 -3.65,-1.75 ; -4.65,1.75 -3.65,1.75 ; -3.65,-2.75 -3.65,-1.75 ; -3.65,-0.75 -3.65,-1.75 ; -3.65,0.75 -3.65,1.75 ; -3.65,2.75 -3.65,1.75 ; -2.65,-1.75 -3.65,-1.75 ; -2.65,1.75 -3.65,1.75 ; -1,0 0,0 ; 0,-1 0,0 ; 0,1 0,0 ; 1,0 0,0 ; 2.65,-1.75 3.65,-1.75 ; 2.65,1.75 3.65,1.75 ; 3.65,-2.75 3.65,-1.75 ; 3.65,-0.75 3.65,-1.75 ; 3.65,0.75 3.65,1.75 ; 3.65,2.75 3.65,1.75 ; 4.65,-1.75 3.65,-1.75 ; 4.65,1.75 3.65,1.75 ; -4.3,-2.35 -4.3,-1.15 -3,-1.15 -3,-2.35 -4.3,-2.35 ; -4.3,1.15 -4.3,2.35 -3,2.35 -3,1.15 -4.3,1.15 ; 3,-2.35 3,-1.15 4.3,-1.15 4.3,-2.35 3,-2.35 ; 3,1.15 3,2.35 4.3,2.35 4.3,1.15 3,1.15
Mechanical 14:
  circle w0.1: c0,0 r3.55
  circle w0.1: c0,0 r2.75
  lines w0.1: -3.6,-2.15 -3.6,-1.35 ; -3.6,1.35 -3.6,2.15 ; -3.283,-1.35 -4,-1.35 -4,-2.15 -3.1,-2.15 ; -3.283,1.35 -4,1.35 -4,2.15 -3.1,2.15 ; -3.1,-1.73 -3.1,-2.65 -2.1,-3.65 3.1,-3.65 3.1,-1.73 ; -3.1,1.73 -3.1,2.65 -2.1,3.65 3.1,3.65 3.1,1.73 ; 3.1,-2.15 4,-2.15 4,-1.35 3.283,-1.35 ; 3.1,2.15 4,2.15 4,1.35 3.283,1.35 ; 3.6,-2.15 3.6,-1.35 ; 3.6,1.35 3.6,2.15
Mechanical 15:
  lines w0.1: -4.55,-3.9 -4.55,3.9 4.55,3.9 4.55,-3.9 -4.55,-3.9
3D body "XFMR_SUMIDA_CLS62.stp": height 2.5, standoff 0, extent -4,-3.65 4,3.65

## XFMR_TALEMA_7000xK [mm] "1.6VA Toroidal Transformer, Body 39.6mm x 39.6mm, 70000 Serie"
height 18.5
pads (9):
  round 2.1 hole 1.4: 3(-17.78,15.24) 4(-17.78,10.16) 5(-17.78,-10.16) 6(-17.78,-15.24) 11(17.78,-17.78) 12(17.78,-12.7) 13(17.78,12.7) 14(17.78,17.78)
  round 8 hole 4.5: MEC(0,0)
Top Overlay:
  lines w0.2: -18.81,-11.251 -19.321,-11.589 -19.321,-13.987 -15.604,-11.527 ccw(c0,0) -14.407,-12.993 -16.318,-14.904 ; -18.81,11.251 -19.321,11.589 -19.321,13.987 -15.604,11.527 cw(c0,0) -14.407,12.993 -16.318,14.904 ; -18.116,-16.702 -19.321,-17.907 -19.321,-19.321 -17.907,-19.321 -12.993,-14.407 ccw(c0,0) -11.527,-15.604 -13.987,-19.321 -11.589,-19.321 -9.859,-16.708 ccw(c0,0) -8.185,-17.589 -8.885,-19.321 -6.728,-19.321 -6.331,-18.338 ccw(c0,0) -4.514,-18.868 -4.598,-19.321 4.598,-19.321 4.514,-18.868 ccw(c0,0) 6.331,-18.338 6.728,-19.321 8.885,-19.321 8.185,-17.589 ccw(c0,0) 9.859,-16.708 11.589,-19.321 13.987,-19.321 11.527,-15.604 ccw(c0,0) 12.993,-14.407 16.282,-17.697 ; -18.116,16.702 -19.321,17.907 -19.321,19.321 -17.907,19.321 -12.993,14.407 cw(c0,0) -11.527,15.604 -13.987,19.321 -11.589,19.321 -9.859,16.708 cw(c0,0) -8.185,17.589 -8.885,19.321 -6.728,19.321 -6.331,18.338 cw(c-2.522,8.654) -4.514,18.868 -4.598,19.321 4.598,19.321 4.514,18.868 cw(c0,0) 6.331,18.338 6.728,19.321 8.885,19.321 8.185,17.589 cw(c0,0) 9.859,16.708 11.589,19.321 13.987,19.321 11.527,15.604 cw(c0,0) 12.993,14.407 16.282,17.697 ; -17.324,-8.731 cw(c0,0) -17.589,-8.185 -19.321,-8.885 -19.321,-6.728 -18.338,-6.331 cw(c0,0) -18.868,-4.514 -19.321,-4.598 -19.4,0 -19.321,4.598 -18.868,4.514 cw(c0,0) -18.338,6.331 -19.321,6.728 -19.321,8.885 -17.589,8.185 cw(c0,0) -17.324,8.731 ; 16.42,-12.067 15.604,-11.527 cw(c0,0) 14.407,-12.993 17.697,-16.282 ; 16.42,12.067 15.604,11.527 ccw(c0,0) 14.407,12.993 17.697,16.282 ; 17.863,-19.278 17.908,-19.322 19.321,-19.321 19.321,-17.907 19.278,-17.863 ; 17.863,19.278 17.907,19.321 19.321,19.321 19.321,17.907 19.278,17.863 ; 18.894,-13.705 19.321,-13.987 19.321,-11.589 16.708,-9.859 ccw(c0,0) 17.589,-8.185 19.321,-8.885 19.321,-6.728 18.338,-6.331 ccw(c0,0) 18.868,-4.514 19.321,-4.598 19.321,4.598 18.868,4.514 ccw(c0,0) 18.338,6.331 19.321,6.728 19.321,8.885 17.589,8.185 ccw(c0,0) 16.708,9.859 19.321,11.589 19.321,13.987 18.894,13.705 ; -19.805,-19.805 19.805,-19.805 19.805,19.805 -19.805,19.805 -19.805,-19.805
  text "3" at -14.075,11.025 h1
  text "4" at -16.2,8.35 h1
  text "6" at -14.025,-12.05 h1
  text "5" at -15.775,-9.475 h1
  text "12" at 13.425,-11.175 h1
  text "11" at 10.675,-14.3 h1
  text "13" at 13.7,9.65 h1
  text "14" at 10,13.375 h1
Mechanical 8:
  lines w0.1: -18.28,-15.24 -17.78,-15.24 ; -18.28,-10.16 -17.78,-10.16 ; -18.28,10.16 -17.78,10.16 ; -18.28,15.24 -17.78,15.24 ; -17.78,-15.74 -17.78,-15.24 ; -17.78,-14.74 -17.78,-15.24 ; -17.78,-10.66 -17.78,-10.16 ; -17.78,-9.66 -17.78,-10.16 ; -17.78,9.66 -17.78,10.16 ; -17.78,10.66 -17.78,10.16 ; -17.78,14.74 -17.78,15.24 ; -17.78,15.74 -17.78,15.24 ; -17.28,-15.24 -17.78,-15.24 ; -17.28,-10.16 -17.78,-10.16 ; -17.28,10.16 -17.78,10.16 ; -17.28,15.24 -17.78,15.24 ; -0.5,0 0,0 ; 0,-0.5 0,0 ; 0,0.5 0,0 ; 0.5,0 0,0 ; 17.28,-17.78 17.78,-17.78 ; 17.28,-12.7 17.78,-12.7 ; 17.28,12.7 17.78,12.7 ; 17.28,17.78 17.78,17.78 ; 17.78,-18.28 17.78,-17.78 ; 17.78,-17.28 17.78,-17.78 ; 17.78,-13.2 17.78,-12.7 ; 17.78,-12.2 17.78,-12.7 ; 17.78,12.2 17.78,12.7 ; 17.78,13.2 17.78,12.7 ; 17.78,17.28 17.78,17.78 ; 17.78,18.28 17.78,17.78 ; 18.28,-17.78 17.78,-17.78 ; 18.28,-12.7 17.78,-12.7 ; 18.28,12.7 17.78,12.7 ; 18.28,17.78 17.78,17.78
Mechanical 14:
  circle w0.1: c0,0 r1.8
  lines w0.1: -19.805,-19.805 19.805,-19.805 19.805,19.805 -19.805,19.805 -19.805,-19.805 ; -19.4,0 -19.321,-4.598 -18.868,-4.514 ccw(c0,0) -18.338,-6.331 -19.321,-6.728 -19.321,-8.885 -17.589,-8.185 ccw(c0,0) -16.708,-9.859 -19.321,-11.589 -19.321,-13.987 -15.604,-11.527 ccw(c0,0) -14.407,-12.993 -19.321,-17.907 -19.321,-19.321 -17.907,-19.321 -12.993,-14.407 ccw(c0,0) -11.527,-15.604 -13.987,-19.321 -11.589,-19.321 -9.859,-16.708 ccw(c0,0) -8.185,-17.589 -8.885,-19.321 -6.728,-19.321 -6.331,-18.338 ccw(c0,0) -4.514,-18.868 -4.598,-19.321 4.598,-19.321 4.514,-18.868 ccw(c0,0) 6.331,-18.338 6.728,-19.321 8.885,-19.321 8.185,-17.589 ccw(c0,0) 9.859,-16.708 11.589,-19.321 13.987,-19.321 11.527,-15.604 ccw(c0,0) 12.993,-14.407 17.908,-19.322 19.321,-19.321 19.321,-17.907 14.407,-12.993 ccw(c0,0) 15.604,-11.527 19.321,-13.987 19.321,-11.589 16.708,-9.859 ccw(c0,0) 17.589,-8.185 19.321,-8.885 19.321,-6.728 18.338,-6.331 ccw(c0,0) 18.868,-4.514 19.321,-4.598 19.321,4.598 18.868,4.514 ccw(c0,0) 18.338,6.331 19.321,6.728 19.321,8.885 17.589,8.185 ccw(c0,0) 16.708,9.859 19.321,11.589 19.321,13.987 15.604,11.527 ccw(c0,0) 14.407,12.993 19.321,17.907 19.321,19.321 17.907,19.321 12.993,14.407 ccw(c0,0) 11.527,15.604 13.987,19.321 11.589,19.321 9.859,16.708 ccw(c0,0) 8.185,17.589 8.885,19.321 6.728,19.321 6.331,18.338 ccw(c0,0) 4.514,18.868 4.598,19.321 -4.598,19.321 -4.514,18.868 ccw(c-2.522,8.654) -6.331,18.338 -6.728,19.321 -8.885,19.321 -8.185,17.589 ccw(c0,0) -9.859,16.708 -11.589,19.321 -13.987,19.321 -11.527,15.604 ccw(c0,0) -12.993,14.407 -17.907,19.321 -19.321,19.321 -19.321,17.907 -14.407,12.993 ccw(c0,0) -15.604,11.527 -19.321,13.987 -19.321,11.589 -16.708,9.859 ccw(c0,0) -17.589,8.185 -19.321,8.885 -19.321,6.728 -18.338,6.331 ccw(c0,0) -18.868,4.514 -19.321,4.598 -19.4,0
3D body "XFMR_TALEMA_7000xK.stp": height 18.5, standoff -5.2, extent -19.805,-19.805 19.805,19.805